# Altium footprint library OT Library.PcbLib: 396 footprints (part 4 of 25)
Each footprint in its own frame and in the unit in brackets; x right, y up, seen from the top. Pads: shape width x height; smd on the part's side, far side on the other; paste and mask are expansions set on the pad; w line width, h text height; cw(c..) or ccw(c..) is an arc to the next point about the centre after c.
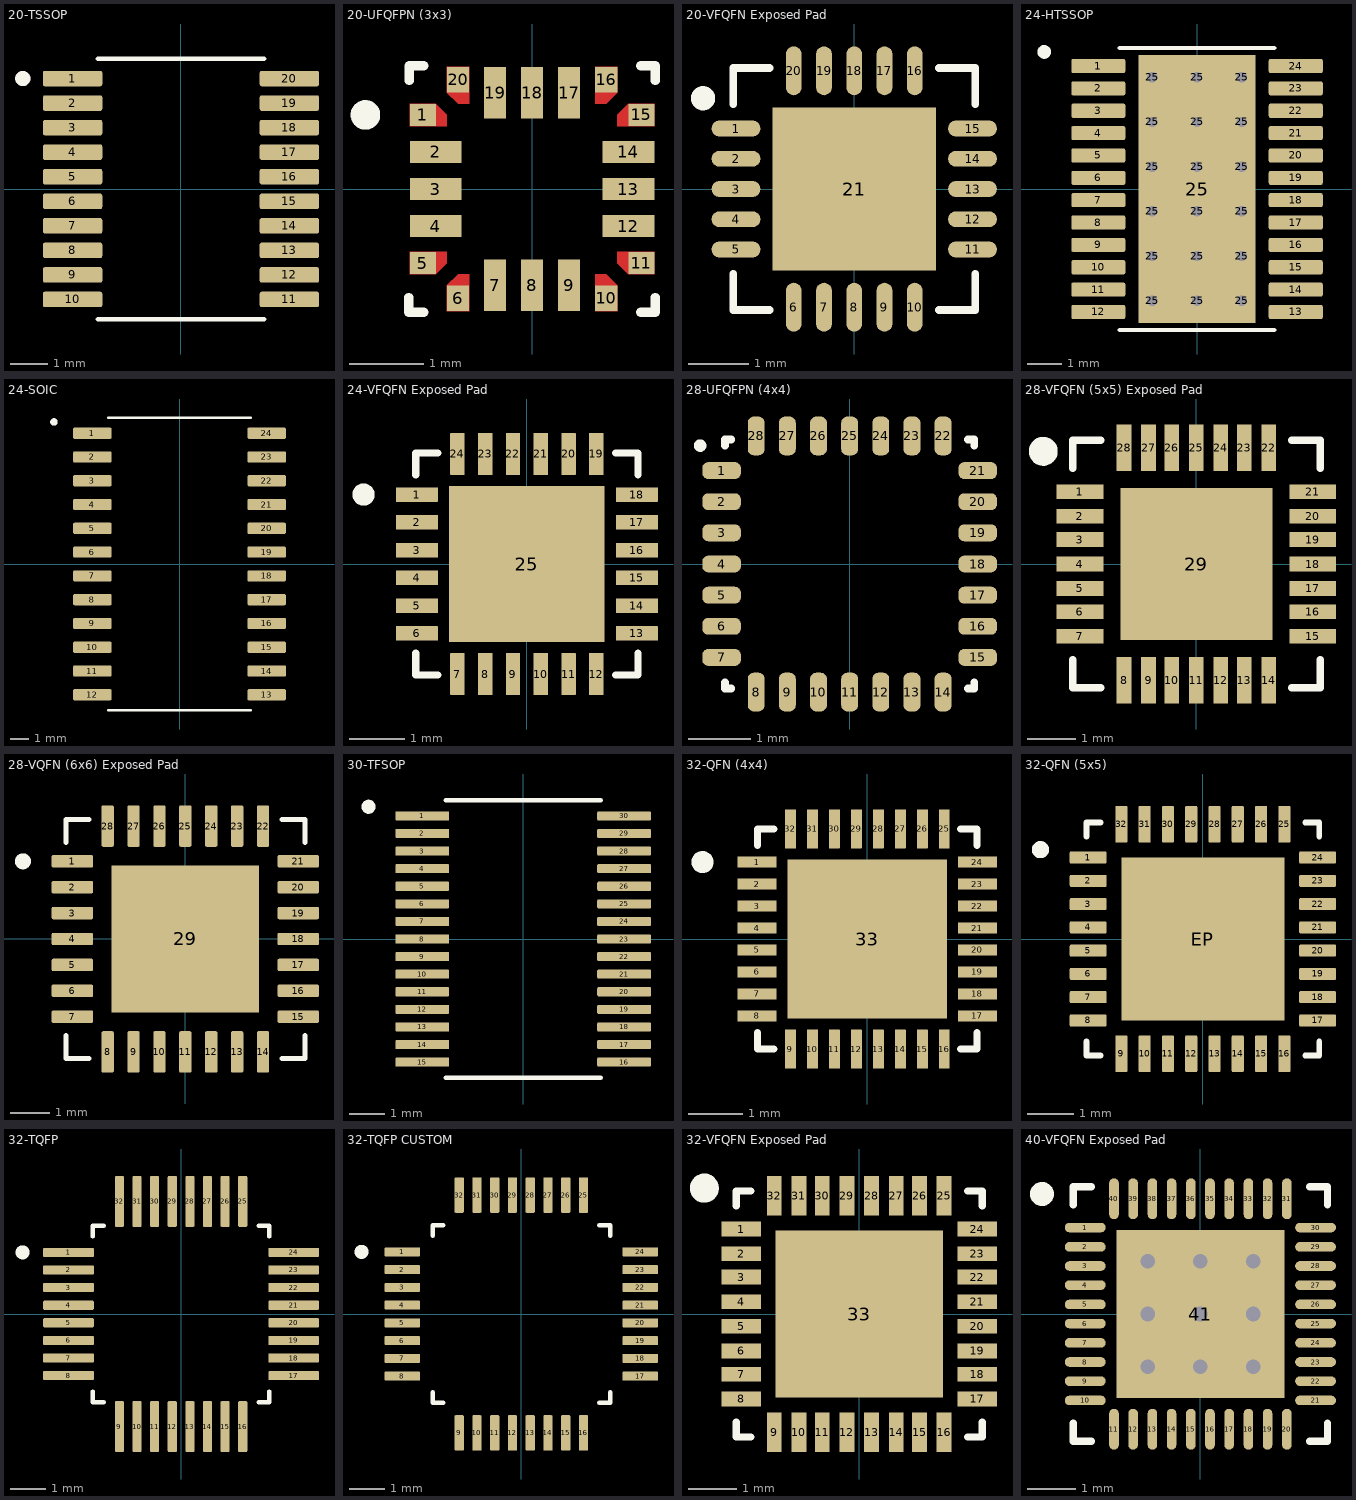
[diagram p3: the footprints below, top view; thin cyan lines are the x and y axes]

## 20-TSSOP [mm] "(0.173\", 4.40mm Width)"
height 1.2
pads (20):
  rrect25% 1.57x0.41 smd: 1(-2.87,2.925) 2(-2.87,2.275) 3(-2.87,1.625) 4(-2.87,0.975) 5(-2.87,0.325) 6(-2.87,-0.325) 7(-2.87,-0.975) 8(-2.87,-1.625) 9(-2.87,-2.275) 10(-2.87,-2.925) 11(2.87,-2.925) 12(2.87,-2.275) 13(2.87,-1.625) 14(2.87,-0.975) 15(2.87,-0.325) 16(2.87,0.325) 17(2.87,0.975) 18(2.87,1.625) 19(2.87,2.275) 20(2.87,2.925)
Top Overlay:
  circle w0.2: c-4.19,2.925 r0.1
  lines w0.127: -2.2,-3.45 2.2,-3.45 ; -2.2,3.45 2.2,3.45
3D Top:
  circle w0.2: c-4.19,2.925 r0.1
3D body: height 1.2, standoff 0, extent -3.2,-3.25 3.2,3.25

## 20-UFQFPN (3x3) [mm]
height 0.6
pads (20):
  rect 0.35x0.3 smd paste-1 mask+0: 1(-1.475,1) 5(-1.475,-1) 11(1.475,-1) 15(1.475,1)
  rect 0.7x0.3 smd mask+0.05: 2(-1.3,0.5) 3(-1.3,0) 4(-1.3,-0.5) 12(1.3,-0.5) 13(1.3,0) 14(1.3,0.5)
  rect 0.3x0.35 smd paste-1 mask+0: 6(-1,-1.475) 10(1,-1.475) 16(1,1.475) 20(-1,1.475)
  rect 0.3x0.7 smd mask+0.05: 7(-0.5,-1.3) 8(0,-1.3) 9(0.5,-1.3) 17(0.5,1.3) 18(0,1.3) 19(-0.5,1.3)
Top Layer:
  region: -1.15,1 -1.15,0.85 -1.65,0.85 -1.65,1.15 -1.3,1.15
  region: -0.85,1.15 -1,1.15 -1.15,1.3 -1.15,1.65 -0.85,1.65
  region: 1.15,1.3 1,1.15 0.85,1.15 0.85,1.65 1.15,1.65
  region: 1.65,0.85 1.15,0.85 1.15,1 1.3,1.15 1.65,1.15
  region: -1.15,-1 -1.3,-1.15 -1.65,-1.15 -1.65,-0.85 -1.15,-0.85
  region: -0.85,-1.65 -1.15,-1.65 -1.15,-1.3 -1,-1.15 -0.85,-1.15
  region: 1.15,-1.3 1.15,-1.65 0.85,-1.65 0.85,-1.15 1,-1.15
  region: 1.65,-1.15 1.3,-1.15 1.15,-1 1.15,-0.85 1.65,-0.85
Top Overlay:
  circle w0.2: c-2.25,1 r0.1
  lines w0.127: -1.665,-1.465 -1.665,-1.665 -1.465,-1.665 ; -1.656,1.465 -1.656,1.665 -1.465,1.665 ; 1.465,-1.665 1.665,-1.665 1.665,-1.465 ; 1.465,1.665 1.665,1.665 1.665,1.465
Top Paste:
  region: -1.15,1 -1.15,0.85 -1.65,0.85 -1.65,1.15 -1.3,1.15
  region: -0.85,1.15 -1,1.15 -1.15,1.3 -1.15,1.65 -0.85,1.65
  region: 1.15,1.3 1,1.15 0.85,1.15 0.85,1.65 1.15,1.65
  region: 1.65,0.85 1.15,0.85 1.15,1 1.3,1.15 1.65,1.15
  region: -1.15,-1 -1.3,-1.15 -1.65,-1.15 -1.65,-0.85 -1.15,-0.85
  region: -0.85,-1.65 -1.15,-1.65 -1.15,-1.3 -1,-1.15 -0.85,-1.15
  region: 1.15,-1.3 1.15,-1.65 0.85,-1.65 0.85,-1.15 1,-1.15
  region: 1.65,-1.15 1.3,-1.15 1.15,-1 1.15,-0.85 1.65,-0.85
Top Solder:
  region: -1.1,1.021 -1.1,0.8 -1.7,0.8 -1.7,1.2 -1.279,1.2
  region: -0.8,1.1 -1.021,1.1 -1.2,1.279 -1.2,1.7 -0.8,1.7
  region: 1.2,1.279 1.021,1.1 0.8,1.1 0.8,1.7 1.2,1.7
  region: 1.7,0.8 1.1,0.8 1.1,1.021 1.279,1.2 1.7,1.2
  region: -1.1,-1.021 -1.279,-1.2 -1.7,-1.2 -1.7,-0.8 -1.1,-0.8
  region: -0.8,-1.7 -1.2,-1.7 -1.2,-1.279 -1.021,-1.1 -0.8,-1.1
  region: 1.2,-1.279 1.2,-1.7 0.8,-1.7 0.8,-1.1 1.021,-1.1
  region: 1.7,-1.2 1.279,-1.2 1.1,-1.021 1.1,-0.8 1.7,-0.8
3D body: height 0.6, standoff 0, extent -1.5,-1.5 1.5,1.5

## 20-VFQFN Exposed Pad [mm] "20-QFN (4x4)"
pads (21):
  oval 0.81x0.26 smd: 1(-1.955,1) 2(-1.955,0.5) 3(-1.955,0) 4(-1.955,-0.5) 5(-1.955,-1) 11(1.955,-1) 12(1.955,-0.5) 13(1.955,0) 14(1.955,0.5) 15(1.955,1)
  oval 0.26x0.81 smd: 6(-1,-1.955) 7(-0.5,-1.955) 8(0,-1.955) 9(0.5,-1.955) 10(1,-1.955) 16(1,1.955) 17(0.5,1.955) 18(0,1.955) 19(-0.5,1.955) 20(-1,1.955)
  rect 2.7x2.7 smd paste-2: 21(0,0)
Top Overlay:
  circle w0.2: c-2.5,1.5 r0.1
  lines w0.127: -2,-1.4 -2,-2 -1.4,-2 ; -2,1.4 -2,2 -1.4,2 ; 1.4,-2 2,-2 2,-1.4 ; 1.4,2 2,2 2,1.4
Top Paste:
  region: 0.85,-0.852 -0.852,-0.852 -0.852,0.85 0.85,0.85
3D body: height 1, standoff 0, extent -2,-2 2,2

## 24-HTSSOP [mm] "24-PowerTSSOP (0.173\", 4.40mm Width)"
pads (43):
  rrect25% 1.57x0.41 smd: 1(-2.87,3.575) 2(-2.87,2.925) 3(-2.87,2.275) 4(-2.87,1.625) 5(-2.87,0.975) 6(-2.87,0.325) 7(-2.87,-0.325) 8(-2.87,-0.975) 9(-2.87,-1.625) 10(-2.87,-2.275) 11(-2.87,-2.925) 12(-2.87,-3.575) 13(2.87,-3.575) 14(2.87,-2.925) 15(2.87,-2.275) 16(2.87,-1.625) 17(2.87,-0.975) 18(2.87,-0.325) 19(2.87,0.325) 20(2.87,0.975) 21(2.87,1.625) 22(2.87,2.275) 23(2.87,2.925) 24(2.87,3.575)
  round 0.5 hole 0.3 mask+0: 25(-1.3,-3.25) 25(-1.3,-1.95) 25(-1.3,-0.65) 25(-1.3,0.65) 25(-1.3,1.95) 25(-1.3,3.25) 25(0,-3.25) 25(0,-1.95) 25(0,-0.65) 25(0,0.65) 25(0,1.95) 25(0,3.25) 25(1.3,-3.25) 25(1.3,-1.95) 25(1.3,-0.65) 25(1.3,0.65) 25(1.3,1.95) 25(1.3,3.25)
  rect 3.4x7.8 smd paste-5 mask+0: 25(0,0)
Top Overlay:
  circle w0.2: c-4.44,3.985 r0.1
  lines w0.127: -2.25,-4.1 2.25,-4.1 ; -2.25,4.1 2.25,4.1
Top Paste:
  region: 1.6,-2.63 -1.6,-2.63 -1.6,2.63 1.6,2.63
Top Solder:
  region: 1.6,-2.63 -1.6,-2.63 -1.6,2.63 1.6,2.63
3D body: height 1.2, standoff 0, extent -3.2,-3.9 3.2,3.9

## 24-SOIC [mm] "24-SOIC (0.295\", 7.50mm Width)"
pads (24):
  rrect25% 2.05x0.6 smd: 1(-4.655,6.985) 2(-4.655,5.715) 3(-4.655,4.445) 4(-4.655,3.175) 5(-4.655,1.905) 6(-4.655,0.635) 7(-4.655,-0.635) 8(-4.655,-1.905) 9(-4.655,-3.175) 10(-4.655,-4.445) 11(-4.655,-5.715) 12(-4.655,-6.985) 13(4.655,-6.985) 14(4.655,-5.715) 15(4.655,-4.445) 16(4.655,-3.175) 17(4.655,-1.905) 18(4.655,-0.635) 19(4.655,0.635) 20(4.655,1.905) 21(4.655,3.175) 22(4.655,4.445) 23(4.655,5.715) 24(4.655,6.985)
Top Overlay:
  circle w0.2: c-6.705,7.585 r0.1
  lines w0.127: -3.8,-7.8 3.8,-7.8 ; -3.8,7.8 3.8,7.8
3D body: height 2.65, standoff 0, extent -5.162,-7.7 5.163,7.7

## 24-VFQFN Exposed Pad [mm] "24-QFN (4x4)"
pads (25):
  rrect7% 0.76x0.26 smd: 1(-1.98,1.25) 2(-1.98,0.75) 3(-1.98,0.25) 4(-1.98,-0.25) 5(-1.98,-0.75) 6(-1.98,-1.25) 13(1.98,-1.25) 14(1.98,-0.75) 15(1.98,-0.25) 16(1.98,0.25) 17(1.98,0.75) 18(1.98,1.25)
  rrect7% 0.26x0.76 smd: 7(-1.25,-1.98) 8(-0.75,-1.98) 9(-0.25,-1.98) 10(0.25,-1.98) 11(0.75,-1.98) 12(1.25,-1.98) 19(1.25,1.98) 20(0.75,1.98) 21(0.25,1.98) 22(-0.25,1.98) 23(-0.75,1.98) 24(-1.25,1.98)
  rect 2.8x2.8 smd paste-2: 25(0,0)
Top Overlay:
  circle w0.2: c-2.94,1.25 r0.1
  lines w0.127: -2,-1.6 -2,-2 -1.6,-2 ; -2,1.6 -2,2 -1.6,2 ; 1.6,-2 2,-2 2,-1.6 ; 1.6,2 2,2 2,1.6
Top Paste:
  region: 1.125,-1.127 0.135,-1.127 0.135,-0.135 1.125,-0.135
  region: -0.135,-1.126 -1.126,-1.126 -1.126,-0.135 -0.135,-0.135
  region: 1.125,0.135 0.135,0.135 0.135,1.125 1.125,1.125
  region: -0.135,0.135 -1.127,0.135 -1.127,1.125 -0.135,1.125
3D body: height 0.95, standoff -0.05, extent -2,-2 2,2

## 28-UFQFPN (4x4) [mm]
pads (28):
  rrect70% 0.62x0.27 smd: 1(-2.055,1.5) 2(-2.055,1) 3(-2.055,0.5) 4(-2.055,0) 5(-2.055,-0.5) 6(-2.055,-1) 7(-2.055,-1.5) 15(2.055,-1.5) 16(2.055,-1) 17(2.055,-0.5) 18(2.055,0) 19(2.055,0.5) 20(2.055,1) 21(2.055,1.5)
  rrect70% 0.27x0.62 smd: 8(-1.5,-2.055) 9(-1,-2.055) 10(-0.5,-2.055) 11(0,-2.055) 12(0.5,-2.055) 13(1,-2.055) 14(1.5,-2.055) 22(1.5,2.055) 23(1,2.055) 24(0.5,2.055) 25(0,2.055) 26(-0.5,2.055) 27(-1,2.055) 28(-1.5,2.055)
Top Overlay:
  circle w0.1: c-2.4,1.9 r0.05
  lines w0.127: -2,-1.9 -2,-2 -1.9,-2 ; -2,1.9 -2,2 -1.9,2 ; 1.9,-2 2,-2 2,-1.9 ; 1.9,2 2,2 2,1.9
3D body: height 0.6, standoff 0, extent -2,-2 2,2

## 28-VFQFN (5x5) Exposed Pad [mil] "28-QFN"
pads (29):
  rect 38x12 smd paste+0 mask+4.02: 1(-95,59) 2(-95,39) 3(-95,20) 4(-95,0) 5(-95,-20) 6(-95,-39) 7(-95,-59) 15(95,-59) 16(95,-39) 17(95,-20) 18(95,0) 19(95,20) 20(95,39) 21(95,59)
  rect 12x38 smd paste+0 mask+4.02: 8(-59,-95) 9(-39,-95) 10(-20,-95) 11(0,-95) 12(20,-95) 13(39,-95) 14(59,-95) 22(59,95) 23(39,95) 24(20,95) 25(0,95) 26(-20,95) 27(-39,95) 28(-59,95)
  rect 124x124 smd paste+0 mask+4.02: 29(0,0)
Top Overlay:
  circle w11.81: c-125,92 r5.91
  lines w6: -101,-78 -101,-101 -78,-101 ; -101,78 -101,101 -78,101 ; 78,-101 101,-101 101,-78 ; 78,101 101,101 101,78
3D body: height 35.43, standoff 0, extent -94.49,-94.49 94.49,94.49

## 28-VQFN (6x6) Exposed Pad [mm]
pads (29):
  rrect25% 1.04x0.31 smd: 1(-2.835,1.95) 2(-2.835,1.3) 3(-2.835,0.65) 4(-2.835,0) 5(-2.835,-0.65) 6(-2.835,-1.3) 7(-2.835,-1.95) 15(2.835,-1.95) 16(2.835,-1.3) 17(2.835,-0.65) 18(2.835,0) 19(2.835,0.65) 20(2.835,1.3) 21(2.835,1.95)
  rrect25% 0.31x1.04 smd: 8(-1.95,-2.835) 9(-1.3,-2.835) 10(-0.65,-2.835) 11(0,-2.835) 12(0.65,-2.835) 13(1.3,-2.835) 14(1.95,-2.835) 22(1.95,2.835) 23(1.3,2.835) 24(0.65,2.835) 25(0,2.835) 26(-0.65,2.835) 27(-1.3,2.835) 28(-1.95,2.835)
  rect 3.7x3.7 smd paste-0.68: 29(0,0)
Top Overlay:
  circle w0.2: c-4.075,1.95 r0.1
  lines w0.127: -3,-2.425 -3,-3 -2.425,-3 ; -3,2.425 -3,3 -2.425,3 ; 2.425,-3 3,-3 3,-2.425 ; 2.425,3 3,3 3,2.425
3D body: height 1, standoff 0, extent -3,-3 3,3

## 30-TFSOP [mm] "30-TSSOP (0.173\", 4.40mm Width)"
pads (30):
  rrect25% 1.53x0.26 smd: 1(-2.87,3.5) 2(-2.87,3) 3(-2.87,2.5) 4(-2.87,2) 5(-2.87,1.5) 6(-2.87,1) 7(-2.87,0.5) 8(-2.87,0) 9(-2.87,-0.5) 10(-2.87,-1) 11(-2.87,-1.5) 12(-2.87,-2) 13(-2.87,-2.5) 14(-2.87,-3) 15(-2.87,-3.5) 16(2.87,-3.5) 17(2.87,-3) 18(2.87,-2.5) 19(2.87,-2) 20(2.87,-1.5) 21(2.87,-1) 22(2.87,-0.5) 23(2.87,0) 24(2.87,0.5) 25(2.87,1) 26(2.87,1.5) 27(2.87,2) 28(2.87,2.5) 29(2.87,3) 30(2.87,3.5)
Top Overlay:
  circle w0.2: c-4.4,3.76 r0.1
  lines w0.127: -2.2,-3.95 2.2,-3.95 ; -2.2,3.95 2.2,3.95
3D body: height 1.2, standoff 0, extent -3.2,-3.9 3.2,3.9

## 32-QFN (4x4) [mm]
pads (33):
  rrect6% 0.71x0.2 smd: 1(-2.005,1.4) 2(-2.005,1) 3(-2.005,0.6) 4(-2.005,0.2) 5(-2.005,-0.2) 6(-2.005,-0.6) 7(-2.005,-1) 8(-2.005,-1.4) 17(2.005,-1.4) 18(2.005,-1) 19(2.005,-0.6) 20(2.005,-0.2) 21(2.005,0.2) 22(2.005,0.6) 23(2.005,1) 24(2.005,1.4)
  rrect6% 0.2x0.71 smd: 9(-1.4,-2.005) 10(-1,-2.005) 11(-0.6,-2.005) 12(-0.2,-2.005) 13(0.2,-2.005) 14(0.6,-2.005) 15(1,-2.005) 16(1.4,-2.005) 25(1.4,2.005) 26(1,2.005) 27(0.6,2.005) 28(0.2,2.005) 29(-0.2,2.005) 30(-0.6,2.005) 31(-1,2.005) 32(-1.4,2.005)
  rect 2.9x2.9 smd paste-2: 33(0,0)
Top Overlay:
  circle w0.2: c-3,1.4 r0.1
  lines w0.127: -2,-1.7 -2,-2 -1.7,-2 ; -2,1.7 -2,2 -1.7,2 ; 1.7,-2 2,-2 2,-1.7 ; 1.7,2 2,2 2,1.7
Top Paste:
  region: 0.917,-0.919 -0.919,-0.919 -0.919,0.917 0.917,0.917
3D body: height 0.55, standoff 0, extent -2,-2 2,2

## 32-QFN (5x5) [mm] "32-VFQFN Exposed Pad"
pads (33):
  rrect21% 0.79x0.26 smd: 1(-2.465,1.75) 2(-2.465,1.25) 3(-2.465,0.75) 4(-2.465,0.25) 5(-2.465,-0.25) 6(-2.465,-0.75) 7(-2.465,-1.25) 8(-2.465,-1.75) 17(2.465,-1.75) 18(2.465,-1.25) 19(2.465,-0.75) 20(2.465,-0.25) 21(2.465,0.25) 22(2.465,0.75) 23(2.465,1.25) 24(2.465,1.75)
  rrect21% 0.26x0.79 smd: 9(-1.75,-2.465) 10(-1.25,-2.465) 11(-0.75,-2.465) 12(-0.25,-2.465) 13(0.25,-2.465) 14(0.75,-2.465) 15(1.25,-2.465) 16(1.75,-2.465) 25(1.75,2.465) 26(1.25,2.465) 27(0.75,2.465) 28(0.25,2.465) 29(-0.25,2.465) 30(-0.75,2.465) 31(-1.25,2.465) 32(-1.75,2.465)
  rect 3.5x3.5 smd paste-3: EP(0,0)
Top Overlay:
  circle w0.18: c-3.49,1.92 r0.095
  lines w0.127: -2.5,-2.2 -2.5,-2.5 -2.2,-2.5 ; -2.5,2.2 -2.5,2.5 -2.2,2.5 ; 2.2,-2.5 2.5,-2.5 2.5,-2.2 ; 2.2,2.5 2.5,2.5 2.5,2.2
Top Paste:
  region: -0.17,-1.41 -1.41,-1.41 -1.41,-0.17 -0.17,-0.17
  region: 1.41,-1.41 0.17,-1.41 0.17,-0.17 1.41,-0.17
  region: -0.17,0.17 -1.41,0.17 -1.41,1.41 -0.17,1.41
  region: 1.41,0.17 0.17,0.17 0.17,1.41 1.41,1.41
3D body: height 1, standoff 0, extent -2.5,-2.5 2.5,2.5

## 32-TQFP [mm] "32-TQFP (5x5)"
pads (32):
  rrect25% 1.44x0.26 smd: 1(-3.195,1.75) 2(-3.195,1.25) 3(-3.195,0.75) 4(-3.195,0.25) 5(-3.195,-0.25) 6(-3.195,-0.75) 7(-3.195,-1.25) 8(-3.195,-1.75) 17(3.195,-1.75) 18(3.195,-1.25) 19(3.195,-0.75) 20(3.195,-0.25) 21(3.195,0.25) 22(3.195,0.75) 23(3.195,1.25) 24(3.195,1.75)
  rrect25% 0.26x1.44 smd: 9(-1.75,-3.195) 10(-1.25,-3.195) 11(-0.75,-3.195) 12(-0.25,-3.195) 13(0.25,-3.195) 14(0.75,-3.195) 15(1.25,-3.195) 16(1.75,-3.195) 25(1.75,3.195) 26(1.25,3.195) 27(0.75,3.195) 28(0.25,3.195) 29(-0.25,3.195) 30(-0.75,3.195) 31(-1.25,3.195) 32(-1.75,3.195)
Top Overlay:
  circle w0.2: c-4.5,1.75 r0.1
  lines w0.127: -2.5,-2.2 -2.5,-2.5 -2.2,-2.5 ; -2.5,2.2 -2.5,2.5 -2.2,2.5 ; 2.2,-2.5 2.5,-2.5 2.5,-2.2 ; 2.2,2.5 2.5,2.5 2.5,2.2
3D body: height 1.18, standoff -0.02, extent -3.5,-3.5 3.5,3.5

## 32-TQFP CUSTOM [mm] "32-TQFP (5x5)"
pads (32):
  rrect25% 1x0.26 smd: 1(-3.35,1.75) 2(-3.35,1.25) 3(-3.35,0.75) 4(-3.35,0.25) 5(-3.35,-0.25) 6(-3.35,-0.75) 7(-3.35,-1.25) 8(-3.35,-1.75) 17(3.35,-1.75) 18(3.35,-1.25) 19(3.35,-0.75) 20(3.35,-0.25) 21(3.35,0.25) 22(3.35,0.75) 23(3.35,1.25) 24(3.35,1.75)
  rrect25% 0.26x1 smd: 9(-1.75,-3.35) 10(-1.25,-3.35) 11(-0.75,-3.35) 12(-0.25,-3.35) 13(0.25,-3.35) 14(0.75,-3.35) 15(1.25,-3.35) 16(1.75,-3.35) 25(1.75,3.35) 26(1.25,3.35) 27(0.75,3.35) 28(0.25,3.35) 29(-0.25,3.35) 30(-0.75,3.35) 31(-1.25,3.35) 32(-1.75,3.35)
Top Overlay:
  circle w0.2: c-4.5,1.75 r0.1
  lines w0.127: -2.5,-2.2 -2.5,-2.5 -2.2,-2.5 ; -2.5,2.2 -2.5,2.5 -2.2,2.5 ; 2.2,-2.5 2.5,-2.5 2.5,-2.2 ; 2.2,2.5 2.5,2.5 2.5,2.2
3D body: height 1.18, standoff -0.02, extent -3.5,-3.5 3.5,3.5

## 32-VFQFN Exposed Pad [mil] "32-HVQFN (5x5)"
pads (33):
  rect 32x12 smd: 1(-96,69) 2(-96,49) 3(-96,30) 4(-96,10) 5(-96,-10) 6(-96,-30) 7(-96,-49) 8(-96,-69) 17(96,-69) 18(96,-49) 19(96,-30) 20(96,-10) 21(96,10) 22(96,30) 23(96,49) 24(96,69)
  rect 12x32 smd: 9(-69,-96) 10(-49,-96) 11(-30,-96) 12(-10,-96) 13(10,-96) 14(30,-96) 15(49,-96) 16(69,-96) 25(69,96) 26(49,96) 27(30,96) 28(10,96) 29(-10,96) 30(-30,96) 31(-49,96) 32(-69,96)
  rect 136x136 smd: 33(0,0)
Top Overlay:
  circle w11.81: c-125.98,102.36 r5.91
  lines w6: -100,-88 -100,-100 -88,-100 ; -100,88 -100,100 -88,100 ; 88,-100 100,-100 100,-88 ; 88,100 100,100 100,88
3D body: height 37.4, standoff -1.97, extent -98.42,-98.42 98.43,98.43

## 40-VFQFN Exposed Pad [mm] "40-QFN (5x5)"
pads (41):
  oval 0.85x0.2 smd: 1(-2.4,1.8) 2(-2.4,1.4) 3(-2.4,1) 4(-2.4,0.6) 5(-2.4,0.2) 6(-2.4,-0.2) 7(-2.4,-0.6) 8(-2.4,-1) 9(-2.4,-1.4) 10(-2.4,-1.8) 21(2.4,-1.8) 22(2.4,-1.4) 23(2.4,-1) 24(2.4,-0.6) 25(2.4,-0.2) 26(2.4,0.2) 27(2.4,0.6) 28(2.4,1) 29(2.4,1.4) 30(2.4,1.8)
  oval 0.2x0.85 smd: 11(-1.8,-2.4) 12(-1.4,-2.4) 13(-1,-2.4) 14(-0.6,-2.4) 15(-0.2,-2.4) 16(0.2,-2.4) 17(0.6,-2.4) 18(1,-2.4) 19(1.4,-2.4) 20(1.8,-2.4) 31(1.8,2.4) 32(1.4,2.4) 33(1,2.4) 34(0.6,2.4) 35(0.2,2.4) 36(-0.2,2.4) 37(-0.6,2.4) 38(-1,2.4) 39(-1.4,2.4) 40(-1.8,2.4)
  rect 3.5x3.5 smd: 41(0,0)
via 1.1,-1.1 diameter 0.61 hole 0.305
via 0,-1.1 diameter 0.61 hole 0.305
via -1.1,-1.1 diameter 0.61 hole 0.305
via 1.1,0 diameter 0.61 hole 0.305
via 0,0 diameter 0.61 hole 0.305
via -1.1,0 diameter 0.61 hole 0.305
via 1.1,1.1 diameter 0.61 hole 0.305
via 0,1.1 diameter 0.61 hole 0.305
via -1.1,1.1 diameter 0.61 hole 0.305
Top Overlay:
  circle w0.25: c-3.3,2.5 r0.125
  lines w0.15: -2.65,-2.275 -2.65,-2.65 -2.275,-2.65 ; -2.65,2.275 -2.65,2.65 -2.275,2.65 ; 2.275,-2.65 2.65,-2.65 2.65,-2.275 ; 2.275,2.65 2.65,2.65 2.65,2.275
Courtyard Top:
  lines w0.1: -0.5,0 0.5,0 ; 0,-0.5 0,0.5
3D body: height 0.5, standoff 0, extent -2.501,-2.501 2.501,2.501